# Altium schematic symbol library jlcpcb_2025_04_capacitors_extended_1210.schlib: 709 symbols (part 1 of 4)
Pins are listed as number, name and electrical type; pins without a type are passive.

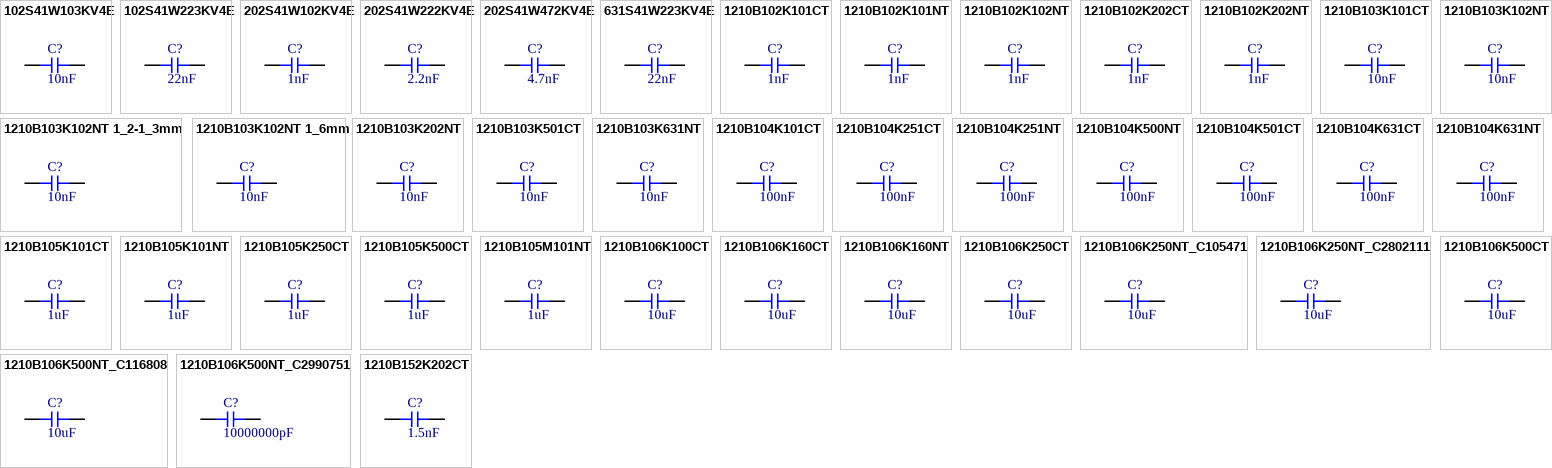
[diagram p0: symbols 102S41W103KV4E to 1210B152K202CT]

## 102S41W103KV4E
designator C?  Capacitance: 10nF  (hidden comment: *)
Capacitor, Ceramic (MLCC), 10nF, ±10%, 1kV, X7R, ±10%, SMD 1210; Manufacturer: Johanson Dielectrics; Manufacturer Part Number: 102S41W103KV4E; Package Size: 1210; JLCPCB Basic Part: No; JLCPCB Part Number: C427531; Supplier 1: LCSC; Category: Capacitors - MLCC; Supplier Part Number 1: C427531; Tolerance: ±10%; Voltage Rating: 1kV; Temperature Coefficient: X7R; RoHS: Yes; ComponentLink1Description: Datasheet; ComponentLink1URL: https://wmsc.lcsc.com/wmsc/upload/file/pdf/v2/lcsc/2304140030_Johanson-Dielectrics-102S41W103KV4E_C427531.pdf; ComponentLink2Description: JLCPCB Part URL; ComponentLink2URL: https://jlcpcb.com/partdetail/C427531; ComponentLink3Description: LCSC Part URL; ComponentLink3URL: https://lcsc.com/product-detail/Multilayer-Ceramic-Capacitors-MLCC---SMD-SMT_Johanson-Dielectrics-Johanson-Dielectrics-102S41W103KV4E_C427531.html
footprint CAP-1210 (1210 (3225M) Capacitor)
pins: 1, 2

## 102S41W223KV4E
designator C?  Capacitance: 22nF  (hidden comment: *)
Capacitor, Ceramic (MLCC), 22nF, ±10%, 1kV, X7R, ±10%, SMD 1210; Manufacturer: Johanson Dielectrics; Manufacturer Part Number: 102S41W223KV4E; Package Size: 1210; JLCPCB Basic Part: No; JLCPCB Part Number: C426620; Supplier 1: LCSC; Category: Capacitors - MLCC; Supplier Part Number 1: C426620; Tolerance: ±10%; Voltage Rating: 1kV; Temperature Coefficient: X7R; RoHS: Yes; ComponentLink1Description: Datasheet; ComponentLink1URL: https://wmsc.lcsc.com/wmsc/upload/file/pdf/v2/lcsc/2304140030_Johanson-Dielectrics-102S41W223KV4E_C426620.pdf; ComponentLink2Description: JLCPCB Part URL; ComponentLink2URL: https://jlcpcb.com/partdetail/C426620; ComponentLink3Description: LCSC Part URL; ComponentLink3URL: https://lcsc.com/product-detail/Multilayer-Ceramic-Capacitors-MLCC---SMD-SMT_Johanson-Dielectrics-Johanson-Dielectrics-102S41W223KV4E_C426620.html
footprint CAP-1210 (1210 (3225M) Capacitor)
pins: 1, 2

## 202S41W102KV4E
designator C?  Capacitance: 1nF  (hidden comment: *)
Capacitor, Ceramic (MLCC), 1nF, ±10%, 2kV, X7R, ±10%, SMD 1210; Manufacturer: Johanson Dielectrics; Manufacturer Part Number: 202S41W102KV4E; Package Size: 1210; JLCPCB Basic Part: No; JLCPCB Part Number: C173219; Supplier 1: LCSC; Category: Capacitors - MLCC; Supplier Part Number 1: C173219; Tolerance: ±10%; Voltage Rating: 2kV; Temperature Coefficient: X7R; RoHS: Yes; ComponentLink1Description: Datasheet; ComponentLink1URL: https://wmsc.lcsc.com/wmsc/upload/file/pdf/v2/lcsc/2304140030_Johanson-Dielectrics-202S41W102KV4E_C173219.pdf; ComponentLink2Description: JLCPCB Part URL; ComponentLink2URL: https://jlcpcb.com/partdetail/C173219; ComponentLink3Description: LCSC Part URL; ComponentLink3URL: https://lcsc.com/product-detail/Multilayer-Ceramic-Capacitors-MLCC---SMD-SMT_Johanson-Dielectrics-Johanson-Dielectrics-202S41W102KV4E_C173219.html
footprint CAP-1210 (1210 (3225M) Capacitor)
pins: 1, 2

## 202S41W222KV4E
designator C?  Capacitance: 2.2nF  (hidden comment: *)
Capacitor, Ceramic (MLCC), 2.2nF, ±10%, 2kV, X7R, ±10%, SMD 1210; Manufacturer: Johanson Dielectrics; Manufacturer Part Number: 202S41W222KV4E; Package Size: 1210; JLCPCB Basic Part: No; JLCPCB Part Number: C426619; Supplier 1: LCSC; Category: Capacitors - MLCC; Supplier Part Number 1: C426619; Tolerance: ±10%; Voltage Rating: 2kV; Temperature Coefficient: X7R; RoHS: Yes; ComponentLink1Description: Datasheet; ComponentLink1URL: https://wmsc.lcsc.com/wmsc/upload/file/pdf/v2/lcsc/2304140030_Johanson-Dielectrics-202S41W222KV4E_C426619.pdf; ComponentLink2Description: JLCPCB Part URL; ComponentLink2URL: https://jlcpcb.com/partdetail/C426619; ComponentLink3Description: LCSC Part URL; ComponentLink3URL: https://lcsc.com/product-detail/Multilayer-Ceramic-Capacitors-MLCC---SMD-SMT_Johanson-Dielectrics-Johanson-Dielectrics-202S41W222KV4E_C426619.html
footprint CAP-1210 (1210 (3225M) Capacitor)
pins: 1, 2

## 202S41W472KV4E
designator C?  Capacitance: 4.7nF  (hidden comment: *)
Capacitor, Ceramic (MLCC), 4.7nF, ±10%, 2kV, X7R, ±10%, SMD 1210; Manufacturer: Johanson Dielectrics; Manufacturer Part Number: 202S41W472KV4E; Package Size: 1210; JLCPCB Basic Part: No; JLCPCB Part Number: C427530; Supplier 1: LCSC; Category: Capacitors - MLCC; Supplier Part Number 1: C427530; Tolerance: ±10%; Voltage Rating: 2kV; Temperature Coefficient: X7R; RoHS: Yes; ComponentLink1Description: Datasheet; ComponentLink1URL: https://wmsc.lcsc.com/wmsc/upload/file/pdf/v2/lcsc/2304140030_Johanson-Dielectrics-202S41W472KV4E_C427530.pdf; ComponentLink2Description: JLCPCB Part URL; ComponentLink2URL: https://jlcpcb.com/partdetail/C427530; ComponentLink3Description: LCSC Part URL; ComponentLink3URL: https://lcsc.com/product-detail/Multilayer-Ceramic-Capacitors-MLCC---SMD-SMT_Johanson-Dielectrics-Johanson-Dielectrics-202S41W472KV4E_C427530.html
footprint CAP-1210 (1210 (3225M) Capacitor)
pins: 1, 2

## 631S41W223KV4E
designator C?  Capacitance: 22nF  (hidden comment: *)
Capacitor, Ceramic (MLCC), 22nF, ±10%, 630V, X7R, ±10%, SMD 1210; Manufacturer: Johanson Dielectrics; Manufacturer Part Number: 631S41W223KV4E; Package Size: 1210; JLCPCB Basic Part: No; JLCPCB Part Number: C431012; Supplier 1: LCSC; Category: Capacitors - MLCC; Supplier Part Number 1: C431012; Tolerance: ±10%; Voltage Rating: 630V; Temperature Coefficient: X7R; RoHS: Yes; ComponentLink1Description: Datasheet; ComponentLink1URL: https://wmsc.lcsc.com/wmsc/upload/file/pdf/v2/lcsc/2304140030_Johanson-Dielectrics-631S41W223KV4E_C431012.pdf; ComponentLink2Description: JLCPCB Part URL; ComponentLink2URL: https://jlcpcb.com/partdetail/C431012; ComponentLink3Description: LCSC Part URL; ComponentLink3URL: https://lcsc.com/product-detail/Multilayer-Ceramic-Capacitors-MLCC---SMD-SMT_Johanson-Dielectrics-Johanson-Dielectrics-631S41W223KV4E_C431012.html
footprint CAP-1210 (1210 (3225M) Capacitor)
pins: 1, 2

## 1210B102K101CT
designator C?  Capacitance: 1nF  (hidden comment: *)
Capacitor, Ceramic (MLCC), 1nF, ±10%, 100V, X7R, ±10%, SMD 1210; Manufacturer: Walsin Tech Corp; Manufacturer Part Number: 1210B102K101CT; Package Size: 1210; JLCPCB Basic Part: No; JLCPCB Part Number: C3871856; Supplier 1: LCSC; Category: Capacitors - MLCC; Supplier Part Number 1: C3871856; Tolerance: ±10%; Voltage Rating: 100V; Temperature Coefficient: X7R; RoHS: Yes; ComponentLink1Description: Datasheet; ComponentLink1URL: https://wmsc.lcsc.com/wmsc/upload/file/pdf/v2/lcsc/2401181517_Walsin-Tech-Corp-1210B102K101CT_C3871856.pdf; ComponentLink2Description: JLCPCB Part URL; ComponentLink2URL: https://jlcpcb.com/partdetail/C3871856; ComponentLink3Description: LCSC Part URL; ComponentLink3URL: https://lcsc.com/product-detail/Multilayer-Ceramic-Capacitors-MLCC---SMD-SMT_Walsin-Tech-Corp-Walsin-Tech-Corp-1210B102K101CT_C3871856.html
footprint CAP-1210 (1210 (3225M) Capacitor)
pins: 1, 2

## 1210B102K101NT
designator C?  Capacitance: 1nF  (hidden comment: *)
Capacitor, Ceramic (MLCC), 1nF, ±10%, 100V, X7R, ±10%, SMD 1210; Manufacturer: FH(Guangdong Fenghua Advanced Tech); Manufacturer Part Number: 1210B102K101NT; Package Size: 1210; JLCPCB Basic Part: No; JLCPCB Part Number: C507413; Supplier 1: LCSC; Category: Capacitors - MLCC; Supplier Part Number 1: C507413; Tolerance: ±10%; Voltage Rating: 100V; Temperature Coefficient: X7R; RoHS: Yes; ComponentLink1Description: Datasheet; ComponentLink1URL: https://wmsc.lcsc.com/wmsc/upload/file/pdf/v2/lcsc/2304140030_FH--Guangdong-Fenghua-Advanced-Tech-1210B102K101NT_C507413.pdf; ComponentLink2Description: JLCPCB Part URL; ComponentLink2URL: https://jlcpcb.com/partdetail/C507413; ComponentLink3Description: LCSC Part URL; ComponentLink3URL: https://lcsc.com/product-detail/Multilayer-Ceramic-Capacitors-MLCC---SMD-SMT_FH-Guangdong-Fenghua-Advanced-Tech-FH-Guangdong-Fenghua-Advanced-Tech-1210B102K101NT_C507413.html
footprint CAP-1210 (1210 (3225M) Capacitor)
pins: 1, 2

## 1210B102K102NT
designator C?  Capacitance: 1nF  (hidden comment: *)
Capacitor, Ceramic (MLCC), 1nF, ±10%, 1kV, ±10%, SMD 1210; Manufacturer: FH-BK(Guangdong Fenghua Bangke Elec); Manufacturer Part Number: 1210B102K102NT; Package Size: 1210; JLCPCB Basic Part: No; JLCPCB Part Number: C2830702; Supplier 1: LCSC; Category: Capacitors - MLCC; Supplier Part Number 1: C2830702; Tolerance: ±10%; Voltage Rating: 1kV; RoHS: Yes; ComponentLink1Description: Datasheet; ComponentLink1URL: https://wmsc.lcsc.com/wmsc/upload/file/pdf/v2/lcsc/2105241635_FH-BK-Guangdong-Fenghua-Bangke-Elec-1210B102K102NT_C2830702.pdf; ComponentLink2Description: JLCPCB Part URL; ComponentLink2URL: https://jlcpcb.com/partdetail/C2830702; ComponentLink3Description: LCSC Part URL; ComponentLink3URL: https://lcsc.com/product-detail/Multilayer-Ceramic-Capacitors-MLCC---SMD-SMT_FH-BKGuangdong-Fenghua-Bangke-Elec-FH-BKGuangdong-Fenghua-Bangke-Elec-1210B102K102NT_C2830702.html
footprint CAP-1210 (1210 (3225M) Capacitor)
pins: 1, 2

## 1210B102K202CT
designator C?  Capacitance: 1nF  (hidden comment: *)
Capacitor, Ceramic (MLCC), 1nF, ±10%, 2kV, X7R, ±10%, SMD 1210; Manufacturer: Walsin Tech Corp; Manufacturer Part Number: 1210B102K202CT; Package Size: 1210; JLCPCB Basic Part: No; JLCPCB Part Number: C304006; Supplier 1: LCSC; Category: Capacitors - MLCC; Supplier Part Number 1: C304006; Tolerance: ±10%; Voltage Rating: 2kV; Temperature Coefficient: X7R; RoHS: Yes; ComponentLink1Description: Datasheet; ComponentLink1URL: https://wmsc.lcsc.com/wmsc/upload/file/pdf/v2/lcsc/2304231850_Walsin-Tech-Corp-1210B102K202CT_C304006.pdf; ComponentLink2Description: JLCPCB Part URL; ComponentLink2URL: https://jlcpcb.com/partdetail/C304006; ComponentLink3Description: LCSC Part URL; ComponentLink3URL: https://lcsc.com/product-detail/Multilayer-Ceramic-Capacitors-MLCC---SMD-SMT_Walsin-Tech-Corp-Walsin-Tech-Corp-1210B102K202CT_C304006.html
footprint CAP-1210 (1210 (3225M) Capacitor)
pins: 1, 2

## 1210B102K202NT
designator C?  Capacitance: 1nF  (hidden comment: *)
Capacitor, Ceramic (MLCC), 1nF, ±10%, 2kV, ±10%, SMD 1210; Manufacturer: FH (Guangdong Fenghua Advanced Tech); Manufacturer Part Number: 1210B102K202NT; Package Size: 1210; JLCPCB Basic Part: No; JLCPCB Part Number: C2836780; Supplier 1: LCSC; Category: Capacitors - MLCC; Supplier Part Number 1: C2836780; Tolerance: ±10%; Voltage Rating: 2kV; RoHS: Yes; ComponentLink1Description: Datasheet; ComponentLink1URL: https://wmsc.lcsc.com/wmsc/upload/file/pdf/v2/lcsc/2304140030_FH--Guangdong-Fenghua-Advanced-Tech-1210B102K202NT_C2836780.pdf; ComponentLink2Description: JLCPCB Part URL; ComponentLink2URL: https://jlcpcb.com/partdetail/C2836780; ComponentLink3Description: LCSC Part URL; ComponentLink3URL: https://lcsc.com/product-detail/Multilayer-Ceramic-Capacitors-MLCC---SMD-SMT_FH-Guangdong-Fenghua-Advanced-Tech-FH-Guangdong-Fenghua-Advanced-Tech-1210B102K202NT_C2836780.html
footprint CAP-1210 (1210 (3225M) Capacitor)
pins: 1, 2

## 1210B103K101CT
designator C?  Capacitance: 10nF  (hidden comment: *)
Capacitor, Ceramic (MLCC), 10nF, ±10%, 100V, X7R, ±10%, SMD 1210; Manufacturer: Walsin Tech Corp; Manufacturer Part Number: 1210B103K101CT; Package Size: 1210; JLCPCB Basic Part: No; JLCPCB Part Number: C3836065; Supplier 1: LCSC; Category: Capacitors - MLCC; Supplier Part Number 1: C3836065; Tolerance: ±10%; Voltage Rating: 100V; Temperature Coefficient: X7R; RoHS: Yes; ComponentLink1Description: Datasheet; ComponentLink1URL: https://wmsc.lcsc.com/wmsc/upload/file/pdf/v2/lcsc/2401181521_Walsin-Tech-Corp-1210B103K101CT_C3836065.pdf; ComponentLink2Description: JLCPCB Part URL; ComponentLink2URL: https://jlcpcb.com/partdetail/C3836065; ComponentLink3Description: LCSC Part URL; ComponentLink3URL: https://lcsc.com/product-detail/Multilayer-Ceramic-Capacitors-MLCC---SMD-SMT_Walsin-Tech-Corp-Walsin-Tech-Corp-1210B103K101CT_C3836065.html
footprint CAP-1210 (1210 (3225M) Capacitor)
pins: 1, 2

## 1210B103K102NT
designator C?  Capacitance: 10nF  (hidden comment: *)
Capacitor, Ceramic (MLCC), 10nF, ±10%, 1kV, X7R, ±10%, SMD 1210; Manufacturer: FH (Guangdong Fenghua Advanced Tech); Manufacturer Part Number: 1210B103K102NT; Package Size: 1210; JLCPCB Basic Part: No; JLCPCB Part Number: C2836779; Supplier 1: LCSC; Category: Capacitors - MLCC; Supplier Part Number 1: C2836779; Tolerance: ±10%; Voltage Rating: 1kV; Temperature Coefficient: X7R; RoHS: Yes; ComponentLink1Description: Datasheet; ComponentLink1URL: https://wmsc.lcsc.com/wmsc/upload/file/pdf/v2/lcsc/2304140030_FH--Guangdong-Fenghua-Advanced-Tech-1210B103K102NT_C2836779.pdf; ComponentLink2Description: JLCPCB Part URL; ComponentLink2URL: https://jlcpcb.com/partdetail/C2836779; ComponentLink3Description: LCSC Part URL; ComponentLink3URL: https://lcsc.com/product-detail/Multilayer-Ceramic-Capacitors-MLCC---SMD-SMT_FH-Guangdong-Fenghua-Advanced-Tech-FH-Guangdong-Fenghua-Advanced-Tech-1210B103K102NT_C2836779.html
footprint CAP-1210 (1210 (3225M) Capacitor)
pins: 1, 2

## 1210B103K102NT 1_2-1_3mm
designator C?  Capacitance: 10nF  (hidden comment: *)
Capacitor, Ceramic (MLCC), 10nF, ±10%, 1kV, X7R, ±10%, SMD 1210; Manufacturer: FH(Guangdong Fenghua Advanced Tech); Manufacturer Part Number: 1210B103K102NT 1.2-1.3mm; Package Size: 1210; JLCPCB Basic Part: No; JLCPCB Part Number: C225089; Supplier 1: LCSC; Category: Capacitors - MLCC; Supplier Part Number 1: C225089; Tolerance: ±10%; Voltage Rating: 1kV; Temperature Coefficient: X7R; RoHS: Yes; ComponentLink1Description: Datasheet; ComponentLink1URL: https://wmsc.lcsc.com/wmsc/upload/file/pdf/v2/lcsc/1811141751_FH--Guangdong-Fenghua-Advanced-Tech-1210B103K102NT-1-2-1-3mm_C225089.pdf; ComponentLink2Description: JLCPCB Part URL; ComponentLink2URL: https://jlcpcb.com/partdetail/C225089; ComponentLink3Description: LCSC Part URL; ComponentLink3URL: https://lcsc.com/product-detail/Multilayer-Ceramic-Capacitors-MLCC---SMD-SMT_FH-Guangdong-Fenghua-Advanced-Tech-FH-Guangdong-Fenghua-Advanced-Tech-1210B103K102NT-1.2-1.3mm_C225089.html
footprint CAP-1210 (1210 (3225M) Capacitor)
pins: 1, 2

## 1210B103K102NT 1_6mm
designator C?  Capacitance: 10nF  (hidden comment: *)
Capacitor, Ceramic (MLCC), 10nF, ±10%, 1kV, ±10%, SMD 1210; Manufacturer: FH (Guangdong Fenghua Advanced Tech); Manufacturer Part Number: 1210B103K102NT 1.6mm; Package Size: 1210; JLCPCB Basic Part: No; JLCPCB Part Number: C319457; Supplier 1: LCSC; Category: Capacitors - MLCC; Supplier Part Number 1: C319457; Tolerance: ±10%; Voltage Rating: 1kV; RoHS: Yes; ComponentLink1Description: Datasheet; ComponentLink2Description: JLCPCB Part URL; ComponentLink2URL: https://jlcpcb.com/partdetail/C319457; ComponentLink3Description: LCSC Part URL; ComponentLink3URL: https://lcsc.com/product-detail/Multilayer-Ceramic-Capacitors-MLCC---SMD-SMT_FH-Guangdong-Fenghua-Advanced-Tech-FH-Guangdong-Fenghua-Advanced-Tech-1210B103K102NT-1.6mm_C319457.html
footprint CAP-1210 (1210 (3225M) Capacitor)
pins: 1, 2

## 1210B103K202NT
designator C?  Capacitance: 10nF  (hidden comment: *)
Capacitor, Ceramic (MLCC), 10nF, ±10%, 2kV, X7R, ±10%, SMD 1210; Manufacturer: FH(Guangdong Fenghua Advanced Tech); Manufacturer Part Number: 1210B103K202NT; Package Size: 1210; JLCPCB Basic Part: No; JLCPCB Part Number: C880294; Supplier 1: LCSC; Category: Capacitors - MLCC; Supplier Part Number 1: C880294; Tolerance: ±10%; Voltage Rating: 2kV; Temperature Coefficient: X7R; RoHS: Yes; ComponentLink1Description: Datasheet; ComponentLink1URL: https://wmsc.lcsc.com/wmsc/upload/file/pdf/v2/lcsc/2304140030_FH--Guangdong-Fenghua-Advanced-Tech-1210B103K202NT_C880294.pdf; ComponentLink2Description: JLCPCB Part URL; ComponentLink2URL: https://jlcpcb.com/partdetail/C880294; ComponentLink3Description: LCSC Part URL; ComponentLink3URL: https://lcsc.com/product-detail/Multilayer-Ceramic-Capacitors-MLCC---SMD-SMT_FH-Guangdong-Fenghua-Advanced-Tech-FH-Guangdong-Fenghua-Advanced-Tech-1210B103K202NT_C880294.html
footprint CAP-1210 (1210 (3225M) Capacitor)
pins: 1, 2

## 1210B103K501CT
designator C?  Capacitance: 10nF  (hidden comment: *)
Capacitor, Ceramic (MLCC), 10nF, ±10%, 500V, X7R, ±10%, SMD 1210; Manufacturer: Walsin Tech Corp; Manufacturer Part Number: 1210B103K501CT; Package Size: 1210; JLCPCB Basic Part: No; JLCPCB Part Number: C2885455; Supplier 1: LCSC; Category: Capacitors - MLCC; Supplier Part Number 1: C2885455; Tolerance: ±10%; Voltage Rating: 500V; Temperature Coefficient: X7R; RoHS: Yes; ComponentLink1Description: Datasheet; ComponentLink1URL: https://wmsc.lcsc.com/wmsc/upload/file/pdf/v2/lcsc/2108170930_Walsin-Tech-Corp-1210B103K501CT_C2885455.pdf; ComponentLink2Description: JLCPCB Part URL; ComponentLink2URL: https://jlcpcb.com/partdetail/C2885455; ComponentLink3Description: LCSC Part URL; ComponentLink3URL: https://lcsc.com/product-detail/Multilayer-Ceramic-Capacitors-MLCC---SMD-SMT_Walsin-Tech-Corp-Walsin-Tech-Corp-1210B103K501CT_C2885455.html
footprint CAP-1210 (1210 (3225M) Capacitor)
pins: 1, 2

## 1210B103K631NT
designator C?  Capacitance: 10nF  (hidden comment: *)
Capacitor, Ceramic (MLCC), 10nF, ±10%, 630V, X7R, ±10%, SMD 1210; Manufacturer: FH (Guangdong Fenghua Advanced Tech); Manufacturer Part Number: 1210B103K631NT; Package Size: 1210; JLCPCB Basic Part: No; JLCPCB Part Number: C2961279; Supplier 1: LCSC; Category: Capacitors - MLCC; Supplier Part Number 1: C2961279; Tolerance: ±10%; Voltage Rating: 630V; Temperature Coefficient: X7R; RoHS: Yes; ComponentLink1Description: Datasheet; ComponentLink1URL: https://wmsc.lcsc.com/wmsc/upload/file/pdf/v2/lcsc/2201211500_FH--Guangdong-Fenghua-Advanced-Tech-1210B103K631NT_C2961279.pdf; ComponentLink2Description: JLCPCB Part URL; ComponentLink2URL: https://jlcpcb.com/partdetail/C2961279; ComponentLink3Description: LCSC Part URL; ComponentLink3URL: https://lcsc.com/product-detail/Multilayer-Ceramic-Capacitors-MLCC---SMD-SMT_FH-Guangdong-Fenghua-Advanced-Tech-FH-Guangdong-Fenghua-Advanced-Tech-1210B103K631NT_C2961279.html
footprint CAP-1210 (1210 (3225M) Capacitor)
pins: 1, 2

## 1210B104K101CT
designator C?  Capacitance: 100nF  (hidden comment: *)
Capacitor, Ceramic (MLCC), 100nF, ±10%, 100V, X7R, ±10%, SMD 1210; Manufacturer: Walsin Tech Corp; Manufacturer Part Number: 1210B104K101CT; Package Size: 1210; JLCPCB Basic Part: No; JLCPCB Part Number: C880760; Supplier 1: LCSC; Category: Capacitors - MLCC; Supplier Part Number 1: C880760; Tolerance: ±10%; Voltage Rating: 100V; Temperature Coefficient: X7R; RoHS: Yes; ComponentLink1Description: Datasheet; ComponentLink1URL: https://wmsc.lcsc.com/wmsc/upload/file/pdf/v2/lcsc/2304140030_Walsin-Tech-Corp-1210B104K101CT_C880760.pdf; ComponentLink2Description: JLCPCB Part URL; ComponentLink2URL: https://jlcpcb.com/partdetail/C880760; ComponentLink3Description: LCSC Part URL; ComponentLink3URL: https://lcsc.com/product-detail/Multilayer-Ceramic-Capacitors-MLCC---SMD-SMT_Walsin-Tech-Corp-Walsin-Tech-Corp-1210B104K101CT_C880760.html
footprint CAP-1210 (1210 (3225M) Capacitor)
pins: 1, 2

## 1210B104K251CT
designator C?  Capacitance: 100nF  (hidden comment: *)
Capacitor, Ceramic (MLCC), 100nF, ±10%, 250V, X7R, ±10%, SMD 1210; Manufacturer: Walsin Tech Corp; Manufacturer Part Number: 1210B104K251CT; Package Size: 1210; JLCPCB Basic Part: No; JLCPCB Part Number: C304007; Supplier 1: LCSC; Category: Capacitors - MLCC; Supplier Part Number 1: C304007; Tolerance: ±10%; Voltage Rating: 250V; Temperature Coefficient: X7R; RoHS: Yes; ComponentLink1Description: Datasheet; ComponentLink1URL: https://wmsc.lcsc.com/wmsc/upload/file/pdf/v2/lcsc/2304231850_Walsin-Tech-Corp-1210B104K251CT_C304007.pdf; ComponentLink2Description: JLCPCB Part URL; ComponentLink2URL: https://jlcpcb.com/partdetail/C304007; ComponentLink3Description: LCSC Part URL; ComponentLink3URL: https://lcsc.com/product-detail/Multilayer-Ceramic-Capacitors-MLCC---SMD-SMT_Walsin-Tech-Corp-Walsin-Tech-Corp-1210B104K251CT_C304007.html
footprint CAP-1210 (1210 (3225M) Capacitor)
pins: 1, 2

## 1210B104K251NT
designator C?  Capacitance: 100nF  (hidden comment: *)
Capacitor, Ceramic (MLCC), 100nF, ±10%, 250V, X7R, ±10%, SMD 1210; Manufacturer: FH(Guangdong Fenghua Advanced Tech); Manufacturer Part Number: 1210B104K251NT; Package Size: 1210; JLCPCB Basic Part: No; JLCPCB Part Number: C52020; Supplier 1: LCSC; Category: Capacitors - MLCC; Supplier Part Number 1: C52020; Tolerance: ±10%; Voltage Rating: 250V; Temperature Coefficient: X7R; RoHS: Yes; ComponentLink1Description: Datasheet; ComponentLink1URL: https://wmsc.lcsc.com/wmsc/upload/file/pdf/v2/lcsc/2304140030_FH--Guangdong-Fenghua-Advanced-Tech-1210B104K251NT_C52020.pdf; ComponentLink2Description: JLCPCB Part URL; ComponentLink2URL: https://jlcpcb.com/partdetail/C52020; ComponentLink3Description: LCSC Part URL; ComponentLink3URL: https://lcsc.com/product-detail/Multilayer-Ceramic-Capacitors-MLCC---SMD-SMT_FH-Guangdong-Fenghua-Advanced-Tech-FH-Guangdong-Fenghua-Advanced-Tech-1210B104K251NT_C52020.html
footprint CAP-1210 (1210 (3225M) Capacitor)
pins: 1, 2

## 1210B104K500NT
designator C?  Capacitance: 100nF  (hidden comment: *)
Capacitor, Ceramic (MLCC), 100nF, ±10%, 50V, X7R, ±10%, SMD 1210; Manufacturer: FH(Guangdong Fenghua Advanced Tech); Manufacturer Part Number: 1210B104K500NT; Package Size: 1210; JLCPCB Basic Part: No; JLCPCB Part Number: C76567; Supplier 1: LCSC; Category: Capacitors - MLCC; Supplier Part Number 1: C76567; Tolerance: ±10%; Voltage Rating: 50V; Temperature Coefficient: X7R; RoHS: Yes; ComponentLink1Description: Datasheet; ComponentLink1URL: https://wmsc.lcsc.com/wmsc/upload/file/pdf/v2/lcsc/2304140030_FH--Guangdong-Fenghua-Advanced-Tech-1210B104K500NT_C76567.pdf; ComponentLink2Description: JLCPCB Part URL; ComponentLink2URL: https://jlcpcb.com/partdetail/C76567; ComponentLink3Description: LCSC Part URL; ComponentLink3URL: https://lcsc.com/product-detail/Multilayer-Ceramic-Capacitors-MLCC---SMD-SMT_FH-Guangdong-Fenghua-Advanced-Tech-FH-Guangdong-Fenghua-Advanced-Tech-1210B104K500NT_C76567.html
footprint CAP-1210 (1210 (3225M) Capacitor)
pins: 1, 2

## 1210B104K501CT
designator C?  Capacitance: 100nF  (hidden comment: *)
Capacitor, Ceramic (MLCC), 100nF, ±10%, 500V, X7R, ±10%, SMD 1210; Manufacturer: Walsin Tech Corp; Manufacturer Part Number: 1210B104K501CT; Package Size: 1210; JLCPCB Basic Part: No; JLCPCB Part Number: C304008; Supplier 1: LCSC; Category: Capacitors - MLCC; Supplier Part Number 1: C304008; Tolerance: ±10%; Voltage Rating: 500V; Temperature Coefficient: X7R; RoHS: Yes; ComponentLink1Description: Datasheet; ComponentLink1URL: https://wmsc.lcsc.com/wmsc/upload/file/pdf/v2/lcsc/2304231850_Walsin-Tech-Corp-1210B104K501CT_C304008.pdf; ComponentLink2Description: JLCPCB Part URL; ComponentLink2URL: https://jlcpcb.com/partdetail/C304008; ComponentLink3Description: LCSC Part URL; ComponentLink3URL: https://lcsc.com/product-detail/Multilayer-Ceramic-Capacitors-MLCC---SMD-SMT_Walsin-Tech-Corp-Walsin-Tech-Corp-1210B104K501CT_C304008.html
footprint CAP-1210 (1210 (3225M) Capacitor)
pins: 1, 2

## 1210B104K631CT
designator C?  Capacitance: 100nF  (hidden comment: *)
Capacitor, Ceramic (MLCC), 100nF, ±10%, 630V, X7R, ±10%, SMD 1210; Manufacturer: Walsin Tech Corp; Manufacturer Part Number: 1210B104K631CT; Package Size: 1210; JLCPCB Basic Part: No; JLCPCB Part Number: C2991390; Supplier 1: LCSC; Category: Capacitors - MLCC; Supplier Part Number 1: C2991390; Tolerance: ±10%; Voltage Rating: 630V; Temperature Coefficient: X7R; RoHS: Yes; ComponentLink1Description: Datasheet; ComponentLink1URL: https://wmsc.lcsc.com/wmsc/upload/file/pdf/v2/lcsc/2204081930_Walsin-Tech-Corp-1210B104K631CT_C2991390.pdf; ComponentLink2Description: JLCPCB Part URL; ComponentLink2URL: https://jlcpcb.com/partdetail/C2991390; ComponentLink3Description: LCSC Part URL; ComponentLink3URL: https://lcsc.com/product-detail/Multilayer-Ceramic-Capacitors-MLCC---SMD-SMT_Walsin-Tech-Corp-Walsin-Tech-Corp-1210B104K631CT_C2991390.html
footprint CAP-1210 (1210 (3225M) Capacitor)
pins: 1, 2

## 1210B104K631NT
designator C?  Capacitance: 100nF  (hidden comment: *)
Capacitor, Ceramic (MLCC), 100nF, ±10%, 630V, ±10%, SMD 1210; Manufacturer: FH(Guangdong Fenghua Advanced Tech); Manufacturer Part Number: 1210B104K631NT; Package Size: 1210; JLCPCB Basic Part: No; JLCPCB Part Number: C1322392; Supplier 1: LCSC; Category: Capacitors - MLCC; Supplier Part Number 1: C1322392; Tolerance: ±10%; Voltage Rating: 630V; RoHS: Yes; ComponentLink1Description: Datasheet; ComponentLink1URL: https://wmsc.lcsc.com/wmsc/upload/file/pdf/v2/lcsc/2304140030_FH--Guangdong-Fenghua-Advanced-Tech-1210B104K631NT_C1322392.pdf; ComponentLink2Description: JLCPCB Part URL; ComponentLink2URL: https://jlcpcb.com/partdetail/C1322392; ComponentLink3Description: LCSC Part URL; ComponentLink3URL: https://lcsc.com/product-detail/Multilayer-Ceramic-Capacitors-MLCC---SMD-SMT_FH-Guangdong-Fenghua-Advanced-Tech-FH-Guangdong-Fenghua-Advanced-Tech-1210B104K631NT_C1322392.html
footprint CAP-1210 (1210 (3225M) Capacitor)
pins: 1, 2

## 1210B105K101CT
designator C?  Capacitance: 1uF  (hidden comment: *)
Capacitor, Ceramic (MLCC), 1uF, ±10%, 100V, X7R, ±10%, SMD 1210; Manufacturer: Walsin Tech Corp; Manufacturer Part Number: 1210B105K101CT; Package Size: 1210; JLCPCB Basic Part: No; JLCPCB Part Number: C304009; Supplier 1: LCSC; Category: Capacitors - MLCC; Supplier Part Number 1: C304009; Tolerance: ±10%; Voltage Rating: 100V; Temperature Coefficient: X7R; RoHS: Yes; ComponentLink1Description: Datasheet; ComponentLink1URL: https://wmsc.lcsc.com/wmsc/upload/file/pdf/v2/lcsc/2304140030_Walsin-Tech-Corp-1210B105K101CT_C304009.pdf; ComponentLink2Description: JLCPCB Part URL; ComponentLink2URL: https://jlcpcb.com/partdetail/C304009; ComponentLink3Description: LCSC Part URL; ComponentLink3URL: https://lcsc.com/product-detail/Multilayer-Ceramic-Capacitors-MLCC---SMD-SMT_Walsin-Tech-Corp-Walsin-Tech-Corp-1210B105K101CT_C304009.html
footprint CAP-1210 (1210 (3225M) Capacitor)
pins: 1, 2

## 1210B105K101NT
designator C?  Capacitance: 1uF  (hidden comment: *)
Capacitor, Ceramic (MLCC), 1uF, ±10%, 100V, X7R, ±10%, SMD 1210; Manufacturer: FH(Guangdong Fenghua Advanced Tech); Manufacturer Part Number: 1210B105K101NT; Package Size: 1210; JLCPCB Basic Part: No; JLCPCB Part Number: C24365; Supplier 1: LCSC; Category: Capacitors - MLCC; Supplier Part Number 1: C24365; Tolerance: ±10%; Voltage Rating: 100V; Temperature Coefficient: X7R; RoHS: Yes; ComponentLink1Description: Datasheet; ComponentLink1URL: https://wmsc.lcsc.com/wmsc/upload/file/pdf/v2/lcsc/2304140030_FH--Guangdong-Fenghua-Advanced-Tech-1210B105K101NT_C24365.pdf; ComponentLink2Description: JLCPCB Part URL; ComponentLink2URL: https://jlcpcb.com/partdetail/C24365; ComponentLink3Description: LCSC Part URL; ComponentLink3URL: https://lcsc.com/product-detail/Multilayer-Ceramic-Capacitors-MLCC---SMD-SMT_FH-Guangdong-Fenghua-Advanced-Tech-FH-Guangdong-Fenghua-Advanced-Tech-1210B105K101NT_C24365.html
footprint CAP-1210 (1210 (3225M) Capacitor)
pins: 1, 2

## 1210B105K250CT
designator C?  Capacitance: 1uF  (hidden comment: *)
Capacitor, Ceramic (MLCC), 1uF, ±10%, 25V, X7R, ±10%, SMD 1210; Manufacturer: Walsin Tech Corp; Manufacturer Part Number: 1210B105K250CT; Package Size: 1210; JLCPCB Basic Part: No; JLCPCB Part Number: C304010; Supplier 1: LCSC; Category: Capacitors - MLCC; Supplier Part Number 1: C304010; Tolerance: ±10%; Voltage Rating: 25V; Temperature Coefficient: X7R; RoHS: Yes; ComponentLink1Description: Datasheet; ComponentLink1URL: https://wmsc.lcsc.com/wmsc/upload/file/pdf/v2/lcsc/2304140030_Walsin-Tech-Corp-1210B105K250CT_C304010.pdf; ComponentLink2Description: JLCPCB Part URL; ComponentLink2URL: https://jlcpcb.com/partdetail/C304010; ComponentLink3Description: LCSC Part URL; ComponentLink3URL: https://lcsc.com/product-detail/Multilayer-Ceramic-Capacitors-MLCC---SMD-SMT_Walsin-Tech-Corp-Walsin-Tech-Corp-1210B105K250CT_C304010.html
footprint CAP-1210 (1210 (3225M) Capacitor)
pins: 1, 2

## 1210B105K500CT
designator C?  Capacitance: 1uF  (hidden comment: *)
Capacitor, Ceramic (MLCC), 1uF, ±10%, 50V, X7R, ±10%, SMD 1210; Manufacturer: Walsin Tech Corp; Manufacturer Part Number: 1210B105K500CT; Package Size: 1210; JLCPCB Basic Part: No; JLCPCB Part Number: C384715; Supplier 1: LCSC; Category: Capacitors - MLCC; Supplier Part Number 1: C384715; Tolerance: ±10%; Voltage Rating: 50V; Temperature Coefficient: X7R; RoHS: Yes; ComponentLink1Description: Datasheet; ComponentLink1URL: https://wmsc.lcsc.com/wmsc/upload/file/pdf/v2/lcsc/2304140030_Walsin-Tech-Corp-1210B105K500CT_C384715.pdf; ComponentLink2Description: JLCPCB Part URL; ComponentLink2URL: https://jlcpcb.com/partdetail/C384715; ComponentLink3Description: LCSC Part URL; ComponentLink3URL: https://lcsc.com/product-detail/Multilayer-Ceramic-Capacitors-MLCC---SMD-SMT_Walsin-Tech-Corp-Walsin-Tech-Corp-1210B105K500CT_C384715.html
footprint CAP-1210 (1210 (3225M) Capacitor)
pins: 1, 2

## 1210B105M101NT
designator C?  Capacitance: 1uF  (hidden comment: *)
Capacitor, Ceramic (MLCC), 1uF, ±20%, 100V, X7R, ±20%, SMD 1210; Manufacturer: FH (Guangdong Fenghua Advanced Tech); Manufacturer Part Number: 1210B105M101NT; Package Size: 1210; JLCPCB Basic Part: No; JLCPCB Part Number: C5355267; Supplier 1: LCSC; Category: Capacitors - MLCC; Supplier Part Number 1: C5355267; Tolerance: ±20%; Voltage Rating: 100V; Temperature Coefficient: X7R; RoHS: Yes; ComponentLink1Description: Datasheet; ComponentLink2Description: JLCPCB Part URL; ComponentLink2URL: https://jlcpcb.com/partdetail/C5355267; ComponentLink3Description: LCSC Part URL; ComponentLink3URL: https://lcsc.com/product-detail/Multilayer-Ceramic-Capacitors-MLCC---SMD-SMT_FH-Guangdong-Fenghua-Advanced-Tech-FH-Guangdong-Fenghua-Advanced-Tech-1210B105M101NT_C5355267.html
footprint CAP-1210 (1210 (3225M) Capacitor)
pins: 1, 2

## 1210B106K100CT
designator C?  Capacitance: 10uF  (hidden comment: *)
Capacitor, Ceramic (MLCC), 10uF, ±10%, 10V, X7R, ±10%, SMD 1210; Manufacturer: Walsin Tech Corp; Manufacturer Part Number: 1210B106K100CT; Package Size: 1210; JLCPCB Basic Part: No; JLCPCB Part Number: C304011; Supplier 1: LCSC; Category: Capacitors - MLCC; Supplier Part Number 1: C304011; Tolerance: ±10%; Voltage Rating: 10V; Temperature Coefficient: X7R; RoHS: Yes; ComponentLink1Description: Datasheet; ComponentLink1URL: https://wmsc.lcsc.com/wmsc/upload/file/pdf/v2/lcsc/2304140030_Walsin-Tech-Corp-1210B106K100CT_C304011.pdf; ComponentLink2Description: JLCPCB Part URL; ComponentLink2URL: https://jlcpcb.com/partdetail/C304011; ComponentLink3Description: LCSC Part URL; ComponentLink3URL: https://lcsc.com/product-detail/Multilayer-Ceramic-Capacitors-MLCC---SMD-SMT_Walsin-Tech-Corp-Walsin-Tech-Corp-1210B106K100CT_C304011.html
footprint CAP-1210 (1210 (3225M) Capacitor)
pins: 1, 2

## 1210B106K160CT
designator C?  Capacitance: 10uF  (hidden comment: *)
Capacitor, Ceramic (MLCC), 10uF, ±10%, 16V, X7R, ±10%, SMD 1210; Manufacturer: Walsin Tech Corp; Manufacturer Part Number: 1210B106K160CT; Package Size: 1210; JLCPCB Basic Part: No; JLCPCB Part Number: C515684; Supplier 1: LCSC; Category: Capacitors - MLCC; Supplier Part Number 1: C515684; Tolerance: ±10%; Voltage Rating: 16V; Temperature Coefficient: X7R; RoHS: Yes; ComponentLink1Description: Datasheet; ComponentLink1URL: https://wmsc.lcsc.com/wmsc/upload/file/pdf/v2/lcsc/2304140030_Walsin-Tech-Corp-1210B106K160CT_C515684.pdf; ComponentLink2Description: JLCPCB Part URL; ComponentLink2URL: https://jlcpcb.com/partdetail/C515684; ComponentLink3Description: LCSC Part URL; ComponentLink3URL: https://lcsc.com/product-detail/Multilayer-Ceramic-Capacitors-MLCC---SMD-SMT_Walsin-Tech-Corp-Walsin-Tech-Corp-1210B106K160CT_C515684.html
footprint CAP-1210 (1210 (3225M) Capacitor)
pins: 1, 2

## 1210B106K160NT
designator C?  Capacitance: 10uF  (hidden comment: *)
Capacitor, Ceramic (MLCC), 10uF, ±10%, 16V, X7R, ±10%, SMD 1210; Manufacturer: FH(Guangdong Fenghua Advanced Tech); Manufacturer Part Number: 1210B106K160NT; Package Size: 1210; JLCPCB Basic Part: No; JLCPCB Part Number: C94203; Supplier 1: LCSC; Category: Capacitors - MLCC; Supplier Part Number 1: C94203; Tolerance: ±10%; Voltage Rating: 16V; Temperature Coefficient: X7R; RoHS: Yes; ComponentLink1Description: Datasheet; ComponentLink1URL: https://wmsc.lcsc.com/wmsc/upload/file/pdf/v2/lcsc/2304140030_FH--Guangdong-Fenghua-Advanced-Tech-1210B106K160NT_C94203.pdf; ComponentLink2Description: JLCPCB Part URL; ComponentLink2URL: https://jlcpcb.com/partdetail/C94203; ComponentLink3Description: LCSC Part URL; ComponentLink3URL: https://lcsc.com/product-detail/Multilayer-Ceramic-Capacitors-MLCC---SMD-SMT_FH-Guangdong-Fenghua-Advanced-Tech-FH-Guangdong-Fenghua-Advanced-Tech-1210B106K160NT_C94203.html
footprint CAP-1210 (1210 (3225M) Capacitor)
pins: 1, 2

## 1210B106K250CT
designator C?  Capacitance: 10uF  (hidden comment: *)
Capacitor, Ceramic (MLCC), 10uF, ±10%, 25V, X7R, ±10%, SMD 1210; Manufacturer: Walsin Tech Corp; Manufacturer Part Number: 1210B106K250CT; Package Size: 1210; JLCPCB Basic Part: No; JLCPCB Part Number: C2909422; Supplier 1: LCSC; Category: Capacitors - MLCC; Supplier Part Number 1: C2909422; Tolerance: ±10%; Voltage Rating: 25V; Temperature Coefficient: X7R; RoHS: Yes; ComponentLink1Description: Datasheet; ComponentLink1URL: https://wmsc.lcsc.com/wmsc/upload/file/pdf/v2/lcsc/2110272130_Walsin-Tech-Corp-1210B106K250CT_C2909422.pdf; ComponentLink2Description: JLCPCB Part URL; ComponentLink2URL: https://jlcpcb.com/partdetail/C2909422; ComponentLink3Description: LCSC Part URL; ComponentLink3URL: https://lcsc.com/product-detail/Multilayer-Ceramic-Capacitors-MLCC---SMD-SMT_Walsin-Tech-Corp-Walsin-Tech-Corp-1210B106K250CT_C2909422.html
footprint CAP-1210 (1210 (3225M) Capacitor)
pins: 1, 2

## 1210B106K250NT_C105471
designator C?  Capacitance: 10uF  (hidden comment: *)
Capacitor, Ceramic (MLCC), 10uF, ±10%, 25V, X7R, ±10%, SMD 1210; Manufacturer: FH(Guangdong Fenghua Advanced Tech); Manufacturer Part Number: 1210B106K250NT; Package Size: 1210; JLCPCB Basic Part: No; JLCPCB Part Number: C105471; Supplier 1: LCSC; Category: Capacitors - MLCC; Supplier Part Number 1: C105471; Tolerance: ±10%; Voltage Rating: 25V; Temperature Coefficient: X7R; RoHS: Yes; ComponentLink1Description: Datasheet; ComponentLink1URL: https://wmsc.lcsc.com/wmsc/upload/file/pdf/v2/lcsc/2304140030_FH--Guangdong-Fenghua-Advanced-Tech-1210B106K250NT_C105471.pdf; ComponentLink2Description: JLCPCB Part URL; ComponentLink2URL: https://jlcpcb.com/partdetail/C105471; ComponentLink3Description: LCSC Part URL; ComponentLink3URL: https://lcsc.com/product-detail/Multilayer-Ceramic-Capacitors-MLCC---SMD-SMT_FH-Guangdong-Fenghua-Advanced-Tech-FH-Guangdong-Fenghua-Advanced-Tech-1210B106K250NT_C105471.html
footprint CAP-1210 (1210 (3225M) Capacitor)
pins: 1, 2

## 1210B106K250NT_C2802111
designator C?  Capacitance: 10uF  (hidden comment: *)
Capacitor, Ceramic (MLCC), 10uF, ±10%, 25V, X7R, ±10%, SMD 1210; Manufacturer: FH (Guangdong Fenghua Advanced Tech); Manufacturer Part Number: 1210B106K250NT; Package Size: 1210; JLCPCB Basic Part: No; JLCPCB Part Number: C2802111; Supplier 1: LCSC; Category: Capacitors - MLCC; Supplier Part Number 1: C2802111; Tolerance: ±10%; Voltage Rating: 25V; Temperature Coefficient: X7R; RoHS: Yes; ComponentLink1Description: Datasheet; ComponentLink1URL: https://wmsc.lcsc.com/wmsc/upload/file/pdf/v2/lcsc/2304140030_FH--Guangdong-Fenghua-Advanced-Tech-1210B106K250NT_C2802111.pdf; ComponentLink2Description: JLCPCB Part URL; ComponentLink2URL: https://jlcpcb.com/partdetail/C2802111; ComponentLink3Description: LCSC Part URL; ComponentLink3URL: https://lcsc.com/product-detail/Multilayer-Ceramic-Capacitors-MLCC---SMD-SMT_FH-Guangdong-Fenghua-Advanced-Tech-FH-Guangdong-Fenghua-Advanced-Tech-1210B106K250NT_C2802111.html
footprint CAP-1210 (1210 (3225M) Capacitor)
pins: 1, 2

## 1210B106K500CT
designator C?  Capacitance: 10uF  (hidden comment: *)
Capacitor, Ceramic (MLCC), 10uF, ±10%, 50V, X7R, ±10%, SMD 1210; Manufacturer: Walsin Tech Corp; Manufacturer Part Number: 1210B106K500CT; Package Size: 1210; JLCPCB Basic Part: No; JLCPCB Part Number: C525507; Supplier 1: LCSC; Category: Capacitors - MLCC; Supplier Part Number 1: C525507; Tolerance: ±10%; Voltage Rating: 50V; Temperature Coefficient: X7R; RoHS: Yes; ComponentLink1Description: Datasheet; ComponentLink1URL: https://wmsc.lcsc.com/wmsc/upload/file/pdf/v2/lcsc/2304140030_Walsin-Tech-Corp-1210B106K500CT_C525507.pdf; ComponentLink2Description: JLCPCB Part URL; ComponentLink2URL: https://jlcpcb.com/partdetail/C525507; ComponentLink3Description: LCSC Part URL; ComponentLink3URL: https://lcsc.com/product-detail/Multilayer-Ceramic-Capacitors-MLCC---SMD-SMT_Walsin-Tech-Corp-Walsin-Tech-Corp-1210B106K500CT_C525507.html
footprint CAP-1210 (1210 (3225M) Capacitor)
pins: 1, 2

## 1210B106K500NT_C116808
designator C?  Capacitance: 10uF  (hidden comment: *)
Capacitor, Ceramic (MLCC), 10uF, ±10%, 50V, X7R, ±10%, SMD 1210; Manufacturer: FH(Guangdong Fenghua Advanced Tech); Manufacturer Part Number: 1210B106K500NT; Package Size: 1210; JLCPCB Basic Part: No; JLCPCB Part Number: C116808; Supplier 1: LCSC; Category: Capacitors - MLCC; Supplier Part Number 1: C116808; Tolerance: ±10%; Voltage Rating: 50V; Temperature Coefficient: X7R; RoHS: Yes; ComponentLink1Description: Datasheet; ComponentLink1URL: https://wmsc.lcsc.com/wmsc/upload/file/pdf/v2/lcsc/2304140030_FH--Guangdong-Fenghua-Advanced-Tech-1210B106K500NT_C116808.pdf; ComponentLink2Description: JLCPCB Part URL; ComponentLink2URL: https://jlcpcb.com/partdetail/C116808; ComponentLink3Description: LCSC Part URL; ComponentLink3URL: https://lcsc.com/product-detail/Multilayer-Ceramic-Capacitors-MLCC---SMD-SMT_FH-Guangdong-Fenghua-Advanced-Tech-FH-Guangdong-Fenghua-Advanced-Tech-1210B106K500NT---_C116808.html
footprint CAP-1210 (1210 (3225M) Capacitor)
pins: 1, 2

## 1210B106K500NT_C2990751
designator C?  Capacitance: 10000000pF  (hidden comment: *)
Capacitor, Ceramic (MLCC), 10000000pF, ±10%, 50V, X7R, ±10%, SMD 1210; Manufacturer: FH (Guangdong Fenghua Advanced Tech); Manufacturer Part Number: 1210B106K500NT; Package Size: 1210; JLCPCB Basic Part: No; JLCPCB Part Number: C2990751; Supplier 1: LCSC; Category: Capacitors - MLCC; Supplier Part Number 1: C2990751; Tolerance: ±10%; Voltage Rating: 50V; Temperature Coefficient: X7R; RoHS: Yes; ComponentLink1Description: Datasheet; ComponentLink1URL: https://wmsc.lcsc.com/wmsc/upload/file/pdf/v2/lcsc/2204011630_FH--Guangdong-Fenghua-Advanced-Tech-1210B106K500NT_C2990751.pdf; ComponentLink2Description: JLCPCB Part URL; ComponentLink2URL: https://jlcpcb.com/partdetail/C2990751; ComponentLink3Description: LCSC Part URL; ComponentLink3URL: https://lcsc.com/product-detail/Multilayer-Ceramic-Capacitors-MLCC---SMD-SMT_FH-Guangdong-Fenghua-Advanced-Tech-FH-Guangdong-Fenghua-Advanced-Tech-1210B106K500NT_C2990751.html
footprint CAP-1210 (1210 (3225M) Capacitor)
pins: 1, 2

## 1210B152K202CT
designator C?  Capacitance: 1.5nF  (hidden comment: *)
Capacitor, Ceramic (MLCC), 1.5nF, ±10%, 2kV, X7R, ±10%, SMD 1210; Manufacturer: Walsin Tech Corp; Manufacturer Part Number: 1210B152K202CT; Package Size: 1210; JLCPCB Basic Part: No; JLCPCB Part Number: C304012; Supplier 1: LCSC; Category: Capacitors - MLCC; Supplier Part Number 1: C304012; Tolerance: ±10%; Voltage Rating: 2kV; Temperature Coefficient: X7R; RoHS: Yes; ComponentLink1Description: Datasheet; ComponentLink1URL: https://wmsc.lcsc.com/wmsc/upload/file/pdf/v2/lcsc/2304231850_Walsin-Tech-Corp-1210B152K202CT_C304012.pdf; ComponentLink2Description: JLCPCB Part URL; ComponentLink2URL: https://jlcpcb.com/partdetail/C304012; ComponentLink3Description: LCSC Part URL; ComponentLink3URL: https://lcsc.com/product-detail/Multilayer-Ceramic-Capacitors-MLCC---SMD-SMT_Walsin-Tech-Corp-Walsin-Tech-Corp-1210B152K202CT_C304012.html
footprint CAP-1210 (1210 (3225M) Capacitor)
pins: 1, 2

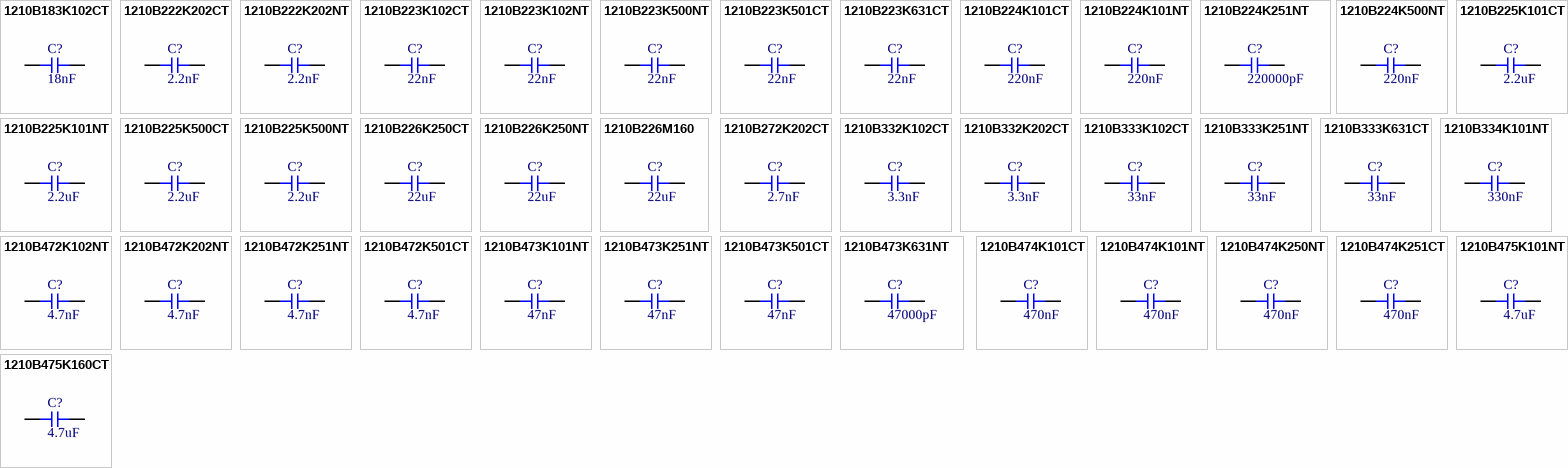
[diagram p1: symbols 1210B183K102CT to 1210B475K160CT]

## 1210B183K102CT
designator C?  Capacitance: 18nF  (hidden comment: *)
Capacitor, Ceramic (MLCC), 18nF, ±10%, 1kV, X7R, ±10%, SMD 1210; Manufacturer: Walsin Tech Corp; Manufacturer Part Number: 1210B183K102CT; Package Size: 1210; JLCPCB Basic Part: No; JLCPCB Part Number: C304013; Supplier 1: LCSC; Category: Capacitors - MLCC; Supplier Part Number 1: C304013; Tolerance: ±10%; Voltage Rating: 1kV; Temperature Coefficient: X7R; RoHS: Yes; ComponentLink1Description: Datasheet; ComponentLink1URL: https://wmsc.lcsc.com/wmsc/upload/file/pdf/v2/lcsc/2304231850_Walsin-Tech-Corp-1210B183K102CT_C304013.pdf; ComponentLink2Description: JLCPCB Part URL; ComponentLink2URL: https://jlcpcb.com/partdetail/C304013; ComponentLink3Description: LCSC Part URL; ComponentLink3URL: https://lcsc.com/product-detail/Multilayer-Ceramic-Capacitors-MLCC---SMD-SMT_Walsin-Tech-Corp-Walsin-Tech-Corp-1210B183K102CT_C304013.html
footprint CAP-1210 (1210 (3225M) Capacitor)
pins: 1, 2
